# Altium footprint library Mine.PcbLib: 306 footprints (part 6 of 20)
Each footprint in its own frame and in the unit in brackets; x right, y up, seen from the top. Pads: shape width x height; smd on the part's side, far side on the other; paste and mask are expansions set on the pad; w line width, h text height; cw(c..) or ccw(c..) is an arc to the next point about the centre after c.
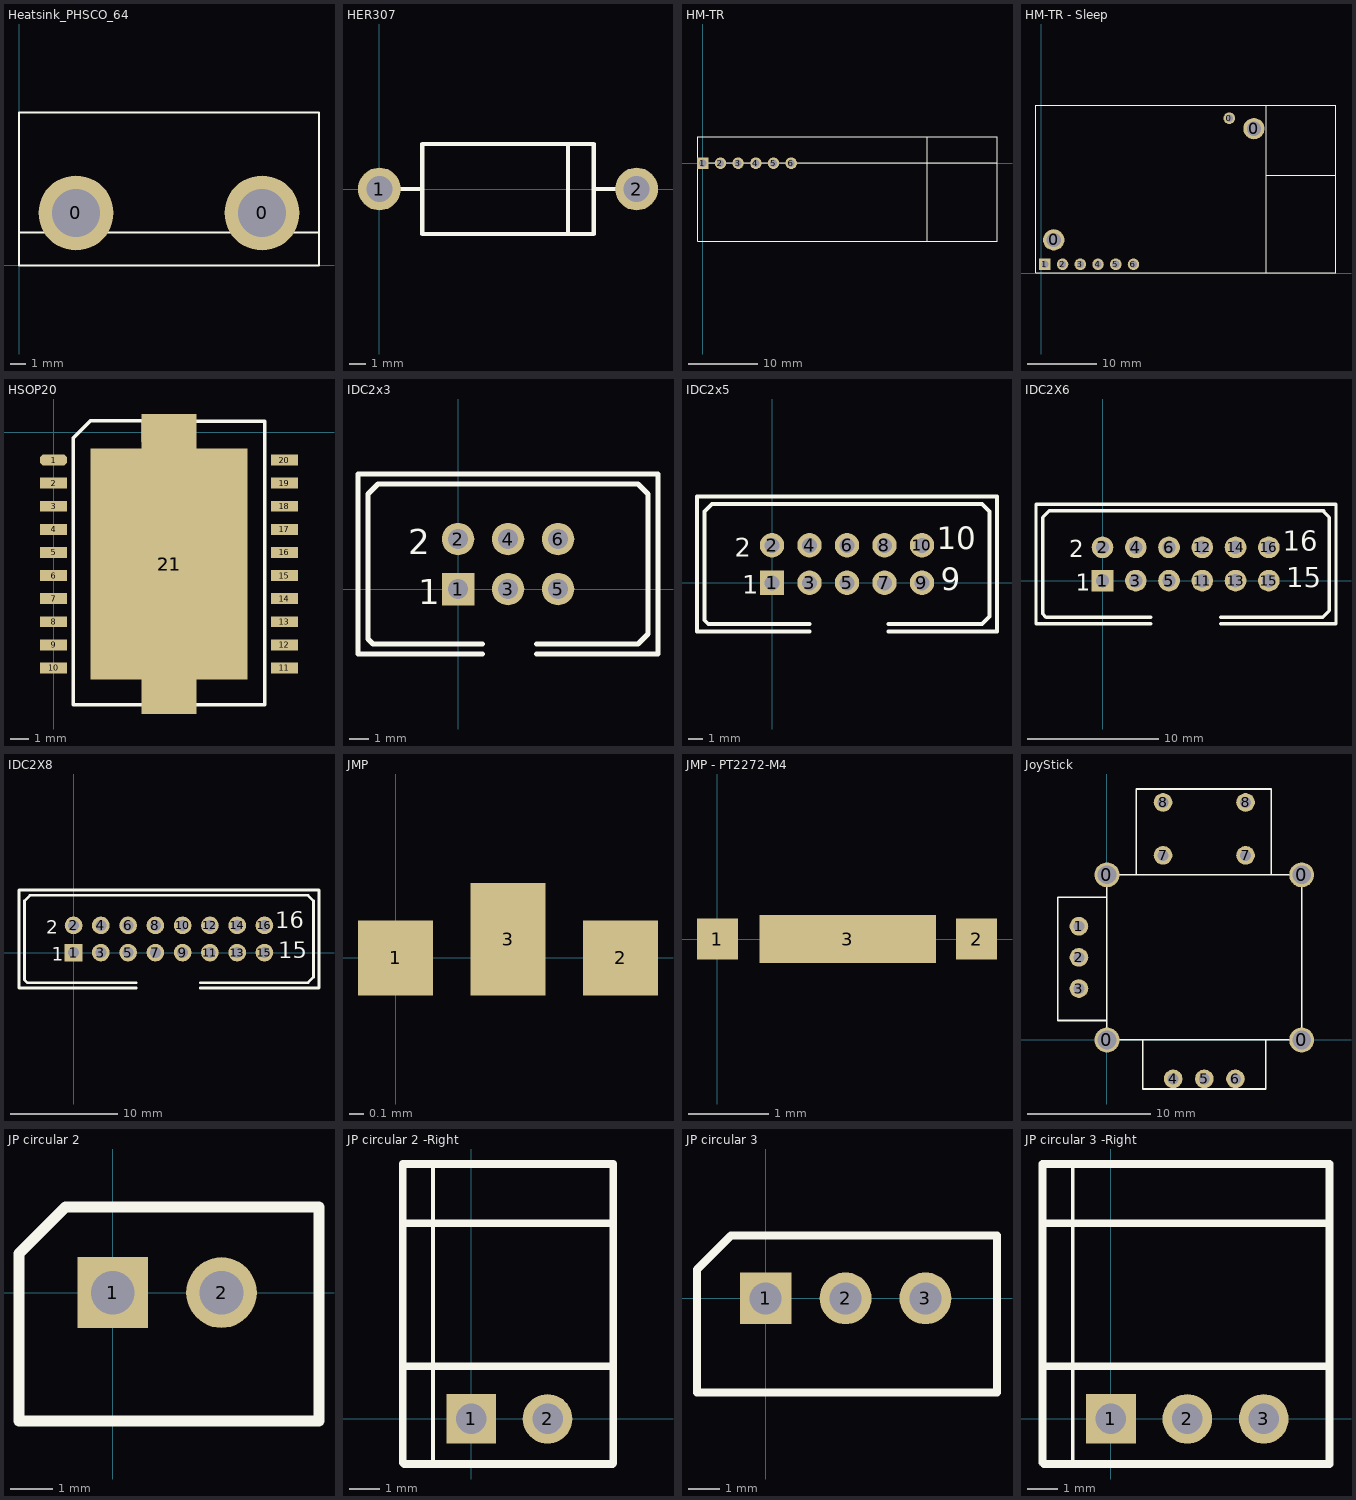
[diagram p5: the footprints below, top view; thin cyan lines are the x and y axes]

## Heatsink_PHSCO_64 [mm]
height 23
pads (2):
  round 5 hole 3.2: 0(3.8,3.5) 0(16.2,3.5)
Top Overlay:
  lines w0.127: 0,2.2 20,2.2 ; 0,0 20,0 20,10.2 0,10.2 0,0

## HER307 [mil]
height 196.85
pads (2):
  round 100 hole 60: 1(0,0) 2(600,0)
Top Overlay:
  lines w10: 45,0 100,0 ; 440,-105 440,105 ; 500,0 555,0 ; 100,0 100,-105 500,-105 500,105 100,105 100,0

## HM-TR [mil]
height 944.88
pads (6):
  rect 65x65 hole 40: 1(0,0)
  round 65 hole 40: 2(100,0) 3(200,0) 4(300,0) 5(400,0) 6(500,0)
Top Overlay:
  lines w5: -29.53,1.97 1663.39,1.97 ; 1269.68,-440.94 1269.68,149.61 ; -29.53,-440.94 -29.53,149.61 1663.39,149.61 1663.39,-440.94 -29.53,-440.94

## HM-TR - Sleep [mil]
height 590.55
pads (9):
  round 120 hole 80: 0(70.55,187.42) 0(1200.47,814.84)
  round 65 hole 40: 0(1061.36,873.9) 2(120.55,49.63) 3(220.55,49.63) 4(320.55,49.63) 5(420.55,49.63) 6(520.55,49.63)
  rect 65x65 hole 40: 1(20.55,49.63)
Top Overlay:
  lines w5: 1269.68,1.97 1269.68,946.85 ; 1269.68,553.15 1663.39,553.15 ; -29.53,1.97 1663.39,1.97 1663.39,946.85 -29.53,946.85 -29.53,1.97

## HSOP20 [mm]
height 3.5
pads (22):
  oct 1.5x0.6 smd: 1(0,-1.524)
  rect 1.5x0.6 smd: 2(0,-2.794) 3(0,-4.064) 4(0,-5.334) 5(0,-6.604) 6(0,-7.874) 7(0,-9.144) 8(0,-10.414) 9(0,-11.684) 10(0,-12.954) 11(12.7,-12.954) 12(12.7,-11.684) 13(12.7,-10.414) 14(12.7,-9.144) 15(12.7,-7.874) 16(12.7,-6.604) 17(12.7,-5.334) 18(12.7,-4.064) 19(12.7,-2.794) 20(12.7,-1.524)
  rect 3x16.5 smd: 21(6.35,-7.239)
  rect 8.636x12.7 smd: 21(6.35,-7.239)
Top Overlay:
  lines w0.2: 1.085,-14.986 4.937,-14.986 4.953,-14.97 4.953,-13.843 7.747,-13.843 7.747,-14.97 7.763,-14.986 11.615,-14.986 11.615,0.619 7.747,0.619 7.747,-0.508 4.953,-0.508 4.937,-0.492 4.937,0.635 2.032,0.635 1.085,-0.312 1.085,-14.986

## IDC2x3 [mil]
pads (6):
  rect 65x65 hole 40: 1(0,0)
  round 65 hole 40: 2(0,100) 3(100,0) 4(100,100) 5(200,0) 6(200,100)
Top Overlay:
  lines w10: 49.21,-130 -200,-130 -200,0 -200,230 400,230 400,-130 157.48,-130 ; 49.21,-110 -170,-110 -180,-100 -180,190 -160,210 360,210 380,190 380,-90 360,-110 157.48,-110
  text "2" at -100,70 h50
  text "1" at -80,-30 h50

## IDC2x5 [mil]
pads (10):
  rect 65x65 hole 40: 1(0,0)
  round 65 hole 40: 2(0,100) 3(100,0) 4(100,100) 5(200,0) 6(200,100) 7(300,0) 8(300,100) 9(400,0) 10(400,100)
Top Overlay:
  lines w10: 100,-130 -200,-130 -200,0 -200,230 600,230 600,-130 310,-130 ; 100,-110 -170,-110 -180,-100 -180,190 -160,210 560,210 580,190 580,-90 560,-110 310,-110
  text "9" at 450,-20 h60
  text "10" at 440,90 h60
  text "2" at -100,70 h50
  text "1" at -80,-30 h50

## IDC2X6 [mil]
pads (12):
  rect 65x65 hole 40: 1(0,0)
  round 65 hole 40: 2(0,100) 3(100,0) 4(100,100) 5(200,0) 6(200,100) 11(300,0) 12(300,100) 13(400,0) 14(400,100) 15(500,0) 16(500,100)
Top Overlay:
  lines w10: 145,-130 -200,-130 -200,0 -200,230 700,230 ; 145,-110 -170,-110 -180,-100 -180,190 -160,210 665,210 ; 355,-130 702,-130 702,230 ; 355,-110 662,-110 682,-90 682,190 662,210
  text "2" at -100,70 h50
  text "1" at -80,-30 h50
  text "16" at 542,90 h60
  text "15" at 552,-20 h60

## IDC2X8 [mil]
pads (16):
  rect 65x65 hole 40: 1(0,0)
  round 65 hole 40: 2(0,100) 3(100,0) 4(100,100) 5(200,0) 6(200,100) 7(300,0) 8(300,100) 9(400,0) 10(400,100) 11(500,0) 12(500,100) 13(600,0) 14(600,100) 15(700,0) 16(700,100)
Top Overlay:
  lines w10: 230,-130 -200,-130 -200,0 -200,230 900,230 900,-130 465,-130 ; 230,-110 -170,-110 -180,-100 -180,190 -160,210 860,210 880,190 880,-90 860,-110 465,-110
  text "16" at 740,90 h60
  text "15" at 750,-20 h60
  text "2" at -100,70 h50
  text "1" at -80,-30 h50

## JMP [mil]
pads (3):
  rect 20x20 smd: 1(0,0) 2(60,0)
  rect 20x30 smd: 3(30,5)

## JMP - PT2272-M4 [mil]
pads (3):
  rect 20x20 smd: 1(0,0) 2(127.14,0)
  rect 86.61x23.62 smd: 3(63.98,0)

## JoyStick [mil]
height 787.4
pads (14):
  round 80 hole 60: 0(0,0) 0(0,530) 0(625,0) 0(625,530)
  round 60 hole 35: 1(-90,365) 2(-90,265) 3(-90,165) 4(212.5,-125) 5(312.5,-125) 6(412.5,-125) 7(180,592.5) 7(445,592.5) 8(180,762.5) 8(445,762.5)
Top Overlay:
  lines w5: 0,62.5 -157.48,62.5 -157.48,457.5 0,457.5 ; 93.74,530 93.74,805.59 526.81,805.59 526.81,530 ; 115,0 115,-157.48 510,-157.48 510,0 ; 0,0 625,0 625,530 0,530 0,0

## JP circular 2 [mil]
height 236.22
pads (2):
  rect 65x65 hole 40: 1(0,0)
  round 65 hole 40: 2(100,0)
Top Overlay:
  lines w10: 187.6,78.74 -43.31,78.74 -86.02,36.02 -86.02,-118.11 189.57,-118.11 189.57,78.74
3D body "022035025.stp": height 216.14, standoff -153.94, extent -95.67,-118.11 195.67,74.81

## JP circular 2 -Right [mil]
height 196.85
pads (2):
  rect 65x65 hole 40: 1(0,0)
  round 65 hole 40: 2(100,0)
Top Overlay:
  lines w5: -50,-59.06 -50,333.66
  lines w10: -89.57,68.9 186.02,68.9 ; -89.57,231.3 -89.57,331.69 ; -89.57,333.66 186.02,333.66 ; 184.06,333.66 186.02,331.69 186.02,242.13 ; -89.57,-57.09 -89.57,255.91 186.02,255.91 186.02,-58.07 185.04,-59.06 -87.6,-59.06 -89.57,-57.09

## JP circular 3 [mil]
height 236.22
pads (3):
  rect 65x65 hole 40: 1(0,0)
  round 65 hole 40: 2(100,0) 3(200,0)
Top Overlay:
  lines w10: -86.02,-118.11 -86.02,36.02 -43.31,78.74 289.57,78.74 289.57,-118.11 -86.02,-118.11
3D body "022035035.stp": height 216.14, standoff -153.94, extent -91.88,-118 297.88,74.91

## JP circular 3 -Right [mil]
height 196.85
pads (3):
  rect 65x65 hole 40: 1(0,0)
  round 65 hole 40: 2(100,0) 3(200,0)
Top Overlay:
  lines w5: -50,-59.06 -50,333.66
  lines w10: -89.57,68.9 286.02,68.9 ; -89.57,231.3 -89.57,331.69 ; -89.57,333.66 286.02,333.66 ; 286.02,-59.06 -87.6,-59.06 -89.57,-57.09 -89.57,255.91 286.02,255.91 286.02,-58.07 ; 286.02,242.13 286.02,331.69